# Altium footprint library Horizont_11_12_2017.PcbLib: 257 footprints (part 16 of 17)
Each footprint in its own frame and in the unit in brackets; x right, y up, seen from the top. Pads: shape width x height; smd on the part's side, far side on the other; paste and mask are expansions set on the pad; w line width, h text height; cw(c..) or ccw(c..) is an arc to the next point about the centre after c.
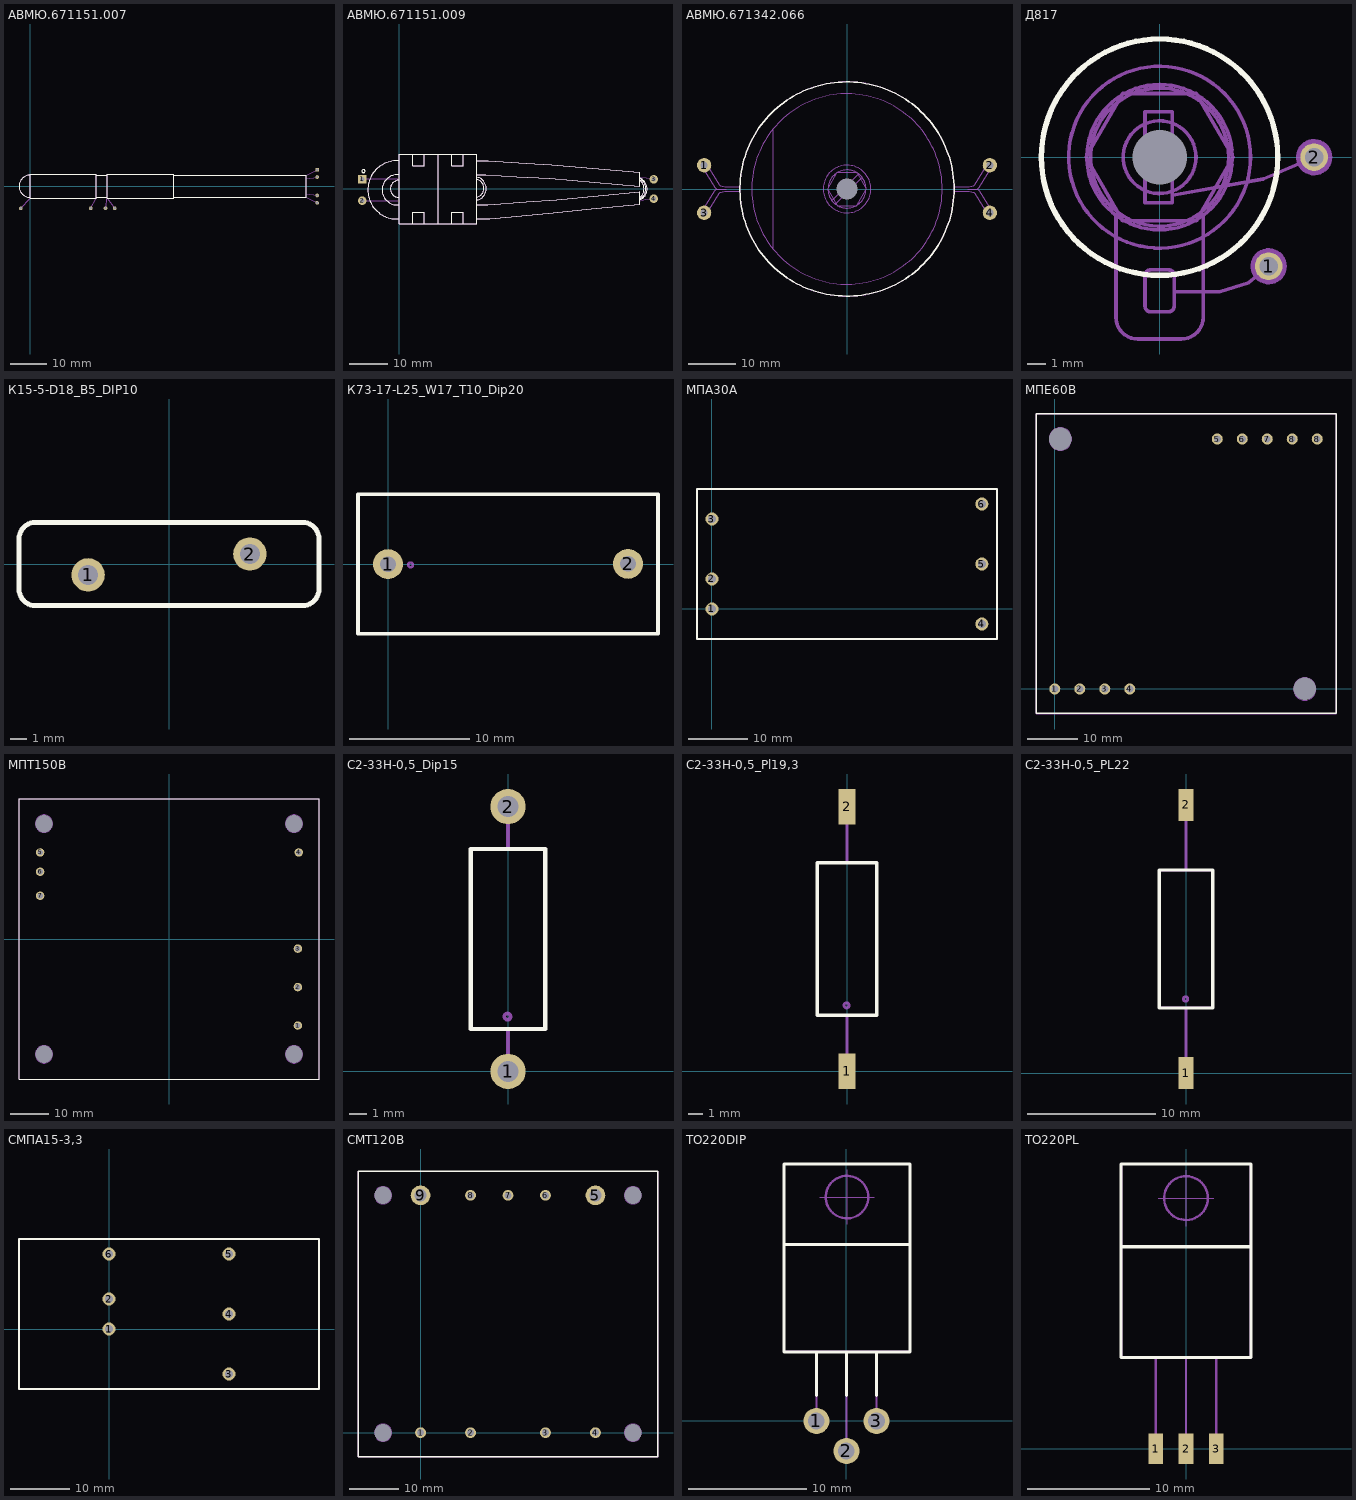
[diagram p15: the footprints below, top view; thin cyan lines are the x and y axes]

## АВМЮ.671151.007 [mm]
height 6.5
pads (8):
  rect 1x1 hole 0.6: 1(78,4.5)
  round 1 hole 0.6: 2(78,2.5) 3(78,-2.5) 4(78,-4.5) 5(-2.5,-6) 6(16.5,-6) 7(20.5,-6) 8(23,-6)
Top Overlay:
  lines w0.25: 0,-3 cw(c0,0) 0,3 ; 18,-3 21,-3 ; 18,3 21,3 ; 39,-3 75,-3 75,3 39,3 ; 0,-3.25 18,-3.25 18,3.25 0,3.25 0,-3.25 ; 21,-3.25 21,3.25 39,3.25 39,-3.25 21,-3.25
Mechanical 1:
  lines w0.2: -2.5,-6 0,-3.25 ; 0,-3 cw(c0,0) 0,3 ; 16.5,-6 18,-3.25 ; 18,-3 21,-3 20.5,-6 ; 18,3 21,3 ; 23,-6 21,-3.25 ; 39,-3 75,-3 ; 39,3 75,3 ; 75,-2 78,-2.5 ; 75,2 78,2.5 ; 78,-4.5 75,-3 ; 78,4.5 75,3 ; 0,-3.25 0,3.25 18,3.25 18,-3.25 ; 0,-3.25 18,-3.25 ; 21,-3.25 39,-3.25 39,3.25 21,3.25 21,-3.25 ; 75,-3 75,3
  text ".Designator" at 45,-0.5 h1.5
  text "8" at 22.5,-8 h2
  text "7" at 20,-8 h2
  text "6" at 17,-8 h2
  text "5" at -1.5,-7.5 h2
  text "3" at 79,-3 h2
  text "4" at 79,-5 h2
  text "2" at 79,2 h2
  text "1" at 79,4 h2
3D body "АВМЮ.671151.007.stp": height 6.49, standoff 0.01, extent -3,-3.25 75,3.25

## АВМЮ.671151.009 [mm]
height 8
pads (4):
  rect 2.2x2.2 hole 1.2: 1(-9.5,2.5)
  round 2.2 hole 1.2: 2(-9.5,-3.009) 3(65.5,2.5) 4(65.5,-2.5)
Top Overlay:
  circle w0.254: c-9.19,4.6 r0.4
  lines w0.25: 0,-7.682 cw(c-0.598,-0.218) 0,7.246 ; 0,-4.055 cw(c-0.532,-0.223) 0,3.609 ; 0,-2.164 cw(c-0.06,0.038) 0,2.241 ; 3.5,-9 3.5,-6 6.5,-6 6.5,-9 ; 3.5,9 3.5,6 6.5,6 6.5,9 ; 10,-9 10,9 ; 13.5,-9 13.5,-6 16.5,-6 16.5,-9 ; 13.5,9 13.5,6 16.5,6 16.5,9 ; 20,-7.682 23.281,-7.682 38.383,-6.268 50.77,-5.009 61.92,-3.966 61.92,-0.735 40.595,-2.794 32.76,-3.3 22.839,-4.055 20,-4.055 ; 20,-2.802 ccw(c19.456,0.112) 20.016,3.024 ; 20,-2.097 ccw(c19.475,0.164) 20,2.426 ; 20,3.644 22.334,3.648 30.295,3.154 38.76,2.74 61.92,0.678 61.92,4.259 39.196,6.291 32.731,6.661 22.965,7.246 20,7.246 ; 61.92,-2.777 ccw(c60.809,0.002) 61.983,2.756 ; 61.92,-2.597 ccw(c60.482,0.028) 61.983,2.618 ; 61.92,-2.231 ccw(c60.067,0.039) 61.92,2.309 ; 0,-9 20,-9 20,9 0,9 0,-9
Mechanical 1:
  lines w0.2: -9.5,-3.009 0,-3.009 ; -9.5,2.682 -0.12,2.682 ; 0,-7.682 cw(c-0.598,-0.218) 0,7.246 ; 0,-4.055 cw(c-0.532,-0.223) 0,3.609 ; 0,-2.164 cw(c-0.06,0.038) 0,2.241 ; 3.5,-9 3.5,-6 6.5,-6 6.5,-9 ; 3.5,9 3.5,6 6.5,6 6.5,9 ; 10,-9 10,9 ; 13.5,-9 13.5,-6 16.5,-6 16.5,-9 ; 13.5,9 13.5,6 16.5,6 16.5,9 ; 20,-7.682 23.281,-7.682 38.383,-6.268 50.77,-5.009 61.92,-3.966 61.92,-0.735 40.595,-2.794 32.76,-3.3 22.839,-4.055 20,-4.055 ; 20,-2.802 ccw(c19.456,0.112) 20.016,3.024 ; 20,-2.097 ccw(c19.475,0.164) 20,2.426 ; 20,3.644 22.334,3.648 30.295,3.154 38.76,2.74 61.92,0.678 61.92,4.259 39.196,6.291 32.731,6.661 22.965,7.246 20,7.246 ; 61.92,-2.777 ccw(c60.809,0.002) 61.983,2.756 ; 61.92,-2.597 ccw(c60.482,0.028) 61.983,2.618 ; 61.92,-2.231 ccw(c60.067,0.039) 61.92,2.309 ; 61.92,3.138 65.232,2.674 65.501,2.942 ; 61.999,-3.03 63.407,-2.619 64.506,-2.556 65.103,-3.089 ; 0,-9 0,9 20,9 20,-9 0,-9
  text ".Designator" at 8,2 h1.5
  text "1" at -11.5,2 h2
  text "2" at -12,-3.5 h2
  text "4" at 67,-3 h2
  text "3" at 67,2 h2
3D body "АВМЮ.671151.009.stp": height 8, standoff 0, extent -7.5,-9 62.117,9

## АВМЮ.671342.066 [mm]
height 23.5
pads (5):
  round 0 hole 4.5 mask+3.5: 0(0,0)
  round 3 hole 1.5: 1(-30,5) 2(30,5) 3(-30,-5) 4(30,-5)
Top Overlay:
  circle w0.3: c0,0 r22.492
Mechanical 1:
  drawing of 623 lines, arcs and shapes, not listed
  text "1" at -18.9,0.8 h1.5
  text ".Comment" at -3,-8 h1.5
  text ".Designator" at -2.3,7.4 h1.5
  text "3" at -18.9,-2.2 h1.5
  text "2" at 17.7,1 h1.5
  text "4" at 17.7,-2 h1.5
Mechanical 2:
  circle w0.2: c0,0 r2
  circle w0.2: c0,0 r5
  lines w0.2: -3.999,-0.073 ccw(c0,0) -2.063,-3.427 ; -3.999,0.073 cw(c0,0) -2.063,3.427 ; -1.936,-3.5 ccw(c0,0) 1.937,-3.5 ; -1.936,3.5 cw(c0,0) 1.937,3.5 ; 2.063,-3.427 ccw(c0,0) 3.999,-0.073 ; 2.063,3.427 cw(c0,0) 3.999,0.073 ; -4.041,0 -2.021,3.5 2.021,3.5 4.041,0 2.021,-3.5 -2.021,-3.5 -4.041,0
3D body "АВМЮ.671342.066.stp": height 23.73, standoff -5.05, extent -22.335,-22.5 22.535,22.402

## Д817 [mil]
height 1023.62
pads (3):
  round 0 hole 118.11 mask+118.11: 0(0,0)
  round 60 hole 40: 1(236.22,-236.22) 2(334.65,0)
Top Overlay:
  circle w11.81: c0,0 r255.91
Mechanical 1:
  circle w7.87: c0,0 r149.61
  circle w7.87: c0,0 r255.91
  circle w7.87: c334.65,0 r35.65
  circle w7.87: c236.22,-236.22 r35.43
  circle w7.87: c0,0 r196.85
  lines w7.87: -31.5,-98.43 -31.5,98.43 27.56,98.43 27.56,-98.43 -27.56,-98.43 ; 27.56,-82.68 224.41,-47.24 334.65,0
  text ".Comment" at -110.24,-307.09 h59.06
  text ".Designator" at -102.36,287.4 h59.06
  text "+" at 283.46,-212.6 h59.06
  text "-" at 346.46,47.24 h59.06
Mechanical 2:
  circle w7.87: c334.65,0 r31.5
  circle w7.87: c236.22,-236.22 r31.5
  circle w7.87: c0,0 r78.74
  lines w7.87: -157.45,-2.87 ccw(c0,0) -81.21,-134.92 ; -157.45,2.87 cw(c0,0) -81.21,134.92 ; -94.49,-125.98 -94.49,-346.46 ccw(c-47.24,-346.46) -47.24,-393.7 47.24,-393.7 ccw(c47.24,-346.46) 94.49,-346.46 94.49,-125.98 ; -76.24,-137.79 ccw(c0,0) 76.24,-137.79 ; -76.24,137.8 cw(c0,0) 76.24,137.8 ; 31.5,-291.34 129.92,-291.34 192.91,-271.65 236.22,-236.22 ; 81.22,-134.92 ccw(c0,0) 157.46,-2.87 ; 81.22,134.92 cw(c0,0) 157.46,2.87 ; -159.11,0 -79.56,-137.79 79.56,-137.79 159.11,0 79.56,137.8 -79.56,137.8 -159.11,0 ; -31.5,-322.83 ccw(c-19.69,-322.83) -19.69,-334.65 19.69,-334.65 ccw(c19.69,-322.83) 31.5,-322.83 31.5,-255.91 ccw(c19.69,-255.91) 19.69,-244.09 -19.69,-244.09 ccw(c-19.69,-255.91) -31.5,-255.91 -31.5,-322.83
3D body "Д817.stp": height 1003.94, standoff -452.76, extent -255.4,-393.7 255.4,253.88

## К15-5-D18_B5_DIP10 [mm]
height 24
pads (2):
  round 2 hole 1.2: 1(-4.85,-0.65) 2(4.85,0.6)
Top Overlay:
  lines w0.3: -6.4,-2.5 7.95,-2.5 ; -6.25,-2.5 -8,-2.5 cw(c-8,-1.5) -9,-1.5 -9,1.5 cw(c-8,1.5) -8,2.5 6.3,2.5 ; 6.25,2.5 8,2.5 cw(c8,1.5) 9,1.5 9,-1.5 cw(c8,-1.5) 8,-2.5
Mechanical 1:
  circle w0.2: c-4.9,-0.65 r0.15
  lines w0.2: -9,-1.5 ccw(c-8,-1.5) -8,-2.5 8,-2.5 ccw(c8,-1.5) 9,-1.5 9,1.5 ccw(c8,1.5) 8,2.5 -8,2.5 ccw(c-8,1.5) -9,1.5 -9,-1.5
  text ".Designator" at -1.32,-0.35 h1.5
3D body "К15-5-3-3кВ-3300пФ.stp": height 22.99, standoff -3, extent -9,-2.5 8.96,2.5

## К73-17-L25_W17_T10_Dip20 [mm]
height 21
pads (2):
  round 2.5 hole 1.3: 1(0,0) 2(20,0.025)
Top Overlay:
  lines w0.3: -2.5,-5.788 22.5,-5.788 22.5,5.813 -2.5,5.813 -2.5,-5.788
Mechanical 1:
  circle w0.2: c1.885,-0.06 r0.2
  lines w0.2: -2.5,-5.788 22.5,-5.788 22.5,5.813 -2.5,5.813 -2.5,-5.788
  text ".Designator" at 7.4,-0.3 h1.5
3D body "К73-17-L25_H18_B12.STEP": height 21, standoff -7, extent -2.5,-6 22.5,6

## МПА30А [mm]
height 12.5
pads (6):
  round 2.2 hole 1.4: 1(0,0) 2(0,5.08) 3(0,15.24) 4(45.72,-2.54) 5(45.72,7.62) 6(45.72,17.78)
Top Overlay:
  lines w0.3: -2.54,-5.08 -2.54,20.32 48.26,20.32 48.26,-5.08 -2.54,-5.08
Mechanical 1:
  lines w0.2: -2.54,-5.08 48.28,-5.08 48.28,20.32 -2.54,20.32 -2.54,-5.08
  text "6" at 45.72,17.78 h2
  text "5" at 45.72,7.62 h2
  text "3" at 0,15.24 h2
  text "1" at 0,-0.635 h2
  text "4" at 45.72,-2.54 h2
  text "2" at 0,5.08 h2
  text ".Designator" at 20.36,10.39 h1.5
  text ".Comment" at 20.54,5.31 h1.5
3D body "МПА30А.stp": height 12.51, standoff -4.5, extent -2.54,-5.08 48.26,20.32

## МПЕ60В [mm]
height 13
pads (11):
  round 0 hole 4.5 unplated mask+3.5: 0(1.13,50) 0(50,0)
  round 2.2 hole 1.4: 1(0,0) 2(5,0) 3(10,0) 4(15,0) 5(32.5,50) 6(37.5,50) 7(42.5,50) 8(47.5,50) 8(52.5,50)
Top Overlay:
  lines w0.3: -3.75,-4.87 -3.75,55 56.25,55 56.25,-4.87 -3.75,-4.87
Mechanical 1:
  circle w0.2: c50,0 r2.25
  circle w0.2: c1.13,50 r2.25
  lines w0.2: -3.75,-5 -3.75,55 56.25,55 56.25,-5 -3.75,-5
  text "7" at 42.5,49.365 h2
  text "6" at 37.5,49.365 h2
  text "5" at 32.5,49.365 h2
  text "3" at 10,-0.635 h2
  text "1" at 0,-0.635 h2
  text "8" at 47.5,49.365 h2
  text "9" at 52.5,49.369 h2
  text "4" at 15,-0.635 h2
  text "2" at 5,-0.635 h2
  text ".Designator" at 21.53,25.63 h1.5
  text ".Comment" at 21.71,20.55 h1.5
3D body "МПЕ60В.stp": height 13.01, standoff -5, extent -3.5,-5 56.5,55

## МПТ150В [mm]
height 20
pads (11):
  round 0 hole 4.5 unplated mask+3.5: 0(-32.5,-30) 0(-32.5,30) 0(32.5,-30) 0(32.5,30)
  round 2.2 hole 1.4: 1(33.5,-22.5) 2(33.5,-12.5) 3(33.5,-2.5) 4(33.75,22.5) 5(-33.5,22.5) 6(-33.5,17.5) 7(-33.5,11.25)
Top Overlay:
  lines w0.3: -39,-36.5 -39,36.5 39,36.5 39,-36.5 -39,-36.5
Mechanical 1:
  circle w0.2: c32.5,-30 r2.25
  circle w0.2: c-32.5,30 r2.25
  circle w0.2: c32.5,30 r2.25
  circle w0.2: c-32.5,-30 r2.25
  lines w0.2: -39,-36.5 39,-36.5 39,36.5 -39,36.5 -39,-36.5
  text ".Comment" at -2.5,-5.25 h1.5
  text ".Designator" at -2,2.5 h1.5
  text "Вход -" at 31.25,-12.75 h2
  text "Корпус" at 30.75,22.25 h2
  text "Выкл" at 31.25,-23 h2
  text "Вход +" at 31.25,-2.5 h2
  text "Выход -" at -36.135,22 h2
  text "Выход +" at -36.135,17 h2
  text "Рег." at -36.135,10.75 h2
3D body "МПТ150В.stp": height 20.51, standoff -5, extent -39,-36.5 39,36.5

## С2-33Н-0,5_Dip15 [mm]
height 4.2
pads (2):
  round 2 hole 1.2: 1(0,0) 2(0,15)
Top Overlay:
  lines w0.25: -2.1,2.4 2.1,2.4 2.1,12.6 -2.1,12.6 -2.1,2.4
Mechanical 1:
  circle w0.2: c-0.03,3.1 r0.18
  lines w0.2: 0,0 0,2.4 ; 0,12.6 0,15 ; -2.1,2.4 2.1,2.4 2.1,12.6 -2.1,12.6 -2.1,2.4
  text ".Designator" at 0.4,6.1 h1.5
3D body "С2-33Н-0,5_Dip15.STEP": height 4.2, standoff -3, extent -2.15,-0.248 2.05,15.352

## С2-33Н-0,5_Pl19,3 [mm]
height 4.2
pads (2):
  rect 1.2x2.5 smd: 1(0,0) 2(0,18.75)
Top Overlay:
  lines w0.25: -2.1,3.975 -2.1,14.775 2.1,14.775 2.1,3.975 -2.1,3.975
Mechanical 1:
  circle w0.2: c-0.03,4.675 r0.18
  lines w0.2: 0,-0.275 0,3.975 ; 0,14.775 0,19.025 ; -2.1,3.975 -2.1,14.775 2.1,14.775 2.1,3.975 -2.1,3.975
  text ".Designator" at 0.4,8.1 h1.5
3D body "С2-33Н-0,5_Pl19,3.STEP": height 4.2, standoff 0, extent -2.141,-0.308 2.059,18.992

## С2-33Н-0,5_PL22 [mm]
height 4.2
pads (2):
  rect 1.2x2.5 smd: 1(0,0) 2(0,21)
Top Overlay:
  lines w0.25: -2.1,5.1 -2.1,15.9 2.1,15.9 2.1,5.1 -2.1,5.1
Mechanical 1:
  circle w0.2: c-0.03,5.8 r0.18
  lines w0.2: 0,-0.5 0,5.1 ; 0,15.9 0,21.5 ; -2.1,5.1 -2.1,15.9 2.1,15.9 2.1,5.1 -2.1,5.1
  text ".Designator" at 0.4,9.1 h1.5
3D body "С2-33Н-0,5_PL22.STEP": height 4.2, standoff 0, extent -2.1,-0.5 2.1,21.5

## СМПА15-3,3 [mm]
height 10
pads (6):
  round 2.2 hole 1.4: 1(0,0) 2(0,5.08) 3(20.32,-7.62) 4(20.32,2.54) 5(20.32,12.7) 6(0,12.7)
Top Overlay:
  lines w0.3: -15.24,-10.16 35.56,-10.16 35.56,15.24 -15.24,15.24 -15.24,-10.16
Mechanical 1:
  lines w0.2: -15.24,-10.16 35.56,-10.16 35.56,15.24 -15.24,15.24 -15.24,-10.16
  text ".Comment" at 7.84,2.77 h1.5
  text ".Designator" at 7.66,7.85 h1.5
  text "2" at 0,5.08 h2
  text "4" at 20.32,2.54 h2
  text "1" at 0,-0.635 h2
  text "3" at 20.32,-7.62 h2
  text "5" at 20.32,12.7 h2
  text "6" at 0,12.7 h2
3D body "СМПА15-3,3.stp": height 10.01, standoff -4, extent -15.24,-10.16 35.56,15.24

## СМТ120В [mm]
height 12.5
pads (13):
  round 0 hole 3.5 unplated mask+3: 0(-7.62,0) 0(-7.62,48.26) 0(43.18,0) 0(43.18,48.26)
  round 2.2 hole 1.4: 1(0,0) 2(10.16,0) 3(25.4,0) 4(35.56,0) 6(25.4,48.26) 7(17.78,48.26) 8(10.16,48.26)
  round 4 hole 2.5: 5(35.56,48.26) 9(0,48.26)
Top Overlay:
  lines w0.3: -12.7,-4.87 -12.7,53.13 48.26,53.13 48.26,-4.87 -12.7,-4.87
Mechanical 1:
  circle w0.2: c-7.62,48.26 r1.75
  circle w0.2: c43.18,48.26 r1.75
  circle w0.2: c43.18,0 r1.75
  circle w0.2: c-7.62,0 r1.75
  lines w0.2: -12.72,-4.87 -12.72,53.13 48.28,53.13 48.28,-4.87 -12.72,-4.87
  text "7" at 17.78,47.625 h2
  text "6" at 25.4,47.625 h2
  text "5" at 35.56,47.625 h2
  text "3" at 25.4,-0.635 h2
  text "1" at 0,-0.635 h2
  text "8" at 10.16,47.625 h2
  text "9" at 0,47.625 h2
  text "4" at 35.56,-0.635 h2
  text "2" at 10.16,-0.635 h2
  text ".Designator" at 15.28,25.63 h1.5
  text ".Comment" at 15.46,20.55 h1.5
3D body "СМТ120В.stp": height 12.51, standoff -5, extent -12.71,-4.87 48.29,53.13

## ТО220DIP [mm]
height 4.8
pads (3):
  round 2.2 hole 1.4: 1(-2.54,0) 2(0,-2.54) 3(2.54,0)
Top Overlay:
  lines w0.25: -5.28,14.942 5.37,14.942 ; -2.54,2.159 -2.54,5.842 ; 0,2.159 0,5.842 ; 2.54,2.159 2.54,5.842 ; -5.28,5.842 -5.28,21.742 5.37,21.742 5.37,5.842 -5.28,5.842
Mechanical 1:
  circle w0.2: c0.045,18.942 r1.8
  lines w0.1: -2.255,18.942 2.345,18.942 ; 0.045,16.642 0.045,21.242
  lines w0.2: -5.28,14.942 5.37,14.942 ; -2.54,0 -2.54,5.842 ; 0,-2.54 0,5.842 ; 2.54,0 2.54,5.842 ; -5.28,5.842 -5.28,21.742 5.37,21.742 5.37,5.842 -5.28,5.842
  text "2" at -0.415,6.59 h1.5
  text "3" at 2.892,6.59 h1.5
  text "1" at -3.59,6.59 h1.5
  text ".Designator" at -1.635,11.672 h1.5
3D body "ТО220DIP.STEP": height 4.8, standoff -3, extent -5.325,-2.98 5.325,21.742

## ТО220PL [mm]
height 4.8
pads (3):
  rect 1.2x2.5 smd: 1(-2.5,0) 2(0,0) 3(2.5,0)
Top Overlay:
  lines w0.25: -5.325,16.6 5.325,16.6 ; -5.325,7.5 -5.325,23.4 5.325,23.4 5.325,7.5 -5.325,7.5
Mechanical 1:
  circle w0.2: c0,20.6 r1.8
  lines w0.1: -2.3,20.6 2.3,20.6 ; 0,18.3 0,22.9
  lines w0.2: -5.325,16.6 5.325,16.6 ; -2.5,-0.5 -2.5,7.5 ; 0,-0.5 0,7.5 ; 2.5,-0.5 2.5,7.5 ; -5.325,7.5 -5.325,23.4 5.325,23.4 5.325,7.5 -5.325,7.5
  text "2" at -0.46,8.248 h1.5
  text "3" at 2.847,8.248 h1.5
  text "1" at -3.635,8.248 h1.5
  text ".Designator" at -1.68,13.33 h1.5
3D body "ТО220PL.STEP": height 4.8, standoff 0, extent -5.325,-0.52 5.325,23.38